# Altium schematic symbol library jlcpcb_2025_04_capacitors_extended_0603.schlib: 3668 symbols (part 14 of 20) (continued)
## FN18N4R7B500PSG
designator C?  Capacitance: 4.7pF  (hidden comment: *)
Capacitor, Ceramic (MLCC), 4.7pF, 50V, NP0, SMD 0603; Manufacturer: PSA(Prosperity Dielectrics); Manufacturer Part Number: FN18N4R7B500PSG; Package Size: 0603; JLCPCB Basic Part: No; JLCPCB Part Number: C565615; Supplier 1: LCSC; Category: Capacitors - MLCC; Supplier Part Number 1: C565615; Voltage Rating: 50V; Temperature Coefficient: NP0; RoHS: Yes; ComponentLink1Description: Datasheet; ComponentLink1URL: https://wmsc.lcsc.com/wmsc/upload/file/pdf/v2/lcsc/2304140030_PSA-Prosperity-Dielectrics-FN18N4R7B500PSG_C565615.pdf; ComponentLink2Description: JLCPCB Part URL; ComponentLink2URL: https://jlcpcb.com/partdetail/C565615; ComponentLink3Description: LCSC Part URL; ComponentLink3URL: https://lcsc.com/product-detail/Multilayer-Ceramic-Capacitors-MLCC---SMD-SMT_PSAProsperity-Dielectrics-PSAProsperity-Dielectrics-FN18N4R7B500PSG_C565615.html
footprint CAP-0603 (0603 (1608M) Capacitor)
pins: 1, 2

## FN18N4R7C500PSG
designator C?  Capacitance: 4.7pF  (hidden comment: *)
Capacitor, Ceramic (MLCC), 4.7pF, 50V, C0G, SMD 0603; Manufacturer: PSA(Prosperity Dielectrics); Manufacturer Part Number: FN18N4R7C500PSG; Package Size: 0603; JLCPCB Basic Part: No; JLCPCB Part Number: C525255; Supplier 1: LCSC; Category: Capacitors - MLCC; Supplier Part Number 1: C525255; Voltage Rating: 50V; Temperature Coefficient: C0G; RoHS: Yes; ComponentLink1Description: Datasheet; ComponentLink1URL: https://wmsc.lcsc.com/wmsc/upload/file/pdf/v2/lcsc/2304140030_PSA-Prosperity-Dielectrics-FN18N4R7C500PSG_C525255.pdf; ComponentLink2Description: JLCPCB Part URL; ComponentLink2URL: https://jlcpcb.com/partdetail/C525255; ComponentLink3Description: LCSC Part URL; ComponentLink3URL: https://lcsc.com/product-detail/Multilayer-Ceramic-Capacitors-MLCC---SMD-SMT_PSAProsperity-Dielectrics-PSAProsperity-Dielectrics-FN18N4R7C500PSG_C525255.html
footprint CAP-0603 (0603 (1608M) Capacitor)
pins: 1, 2

## FN18N5R0C500PSG
designator C?  Capacitance: 5pF  (hidden comment: *)
Capacitor, Ceramic (MLCC), 5pF, 50V, C0G, SMD 0603; Manufacturer: PSA(Prosperity Dielectrics); Manufacturer Part Number: FN18N5R0C500PSG; Package Size: 0603; JLCPCB Basic Part: No; JLCPCB Part Number: C2847431; Supplier 1: LCSC; Category: Capacitors - MLCC; Supplier Part Number 1: C2847431; Voltage Rating: 50V; Temperature Coefficient: C0G; RoHS: Yes; ComponentLink1Description: Datasheet; ComponentLink1URL: https://wmsc.lcsc.com/wmsc/upload/file/pdf/v2/lcsc/2108142130_PSA-Prosperity-Dielectrics-FN18N5R0C500PSG_C2847431.pdf; ComponentLink2Description: JLCPCB Part URL; ComponentLink2URL: https://jlcpcb.com/partdetail/C2847431; ComponentLink3Description: LCSC Part URL; ComponentLink3URL: https://lcsc.com/product-detail/Multilayer-Ceramic-Capacitors-MLCC---SMD-SMT_PSAProsperity-Dielectrics-PSAProsperity-Dielectrics-FN18N5R0C500PSG_C2847431.html
footprint CAP-0603 (0603 (1608M) Capacitor)
pins: 1, 2

## FN18N5R6C500PSG
designator C?  Capacitance: 5.6pF  (hidden comment: *)
Capacitor, Ceramic (MLCC), 5.6pF, 50V, C0G, SMD 0603; Manufacturer: PSA(Prosperity Dielectrics); Manufacturer Part Number: FN18N5R6C500PSG; Package Size: 0603; JLCPCB Basic Part: No; JLCPCB Part Number: C565616; Supplier 1: LCSC; Category: Capacitors - MLCC; Supplier Part Number 1: C565616; Voltage Rating: 50V; Temperature Coefficient: C0G; RoHS: Yes; ComponentLink1Description: Datasheet; ComponentLink1URL: https://wmsc.lcsc.com/wmsc/upload/file/pdf/v2/lcsc/2304140030_PSA-Prosperity-Dielectrics-FN18N5R6C500PSG_C565616.pdf; ComponentLink2Description: JLCPCB Part URL; ComponentLink2URL: https://jlcpcb.com/partdetail/C565616; ComponentLink3Description: LCSC Part URL; ComponentLink3URL: https://lcsc.com/product-detail/Multilayer-Ceramic-Capacitors-MLCC---SMD-SMT_PSAProsperity-Dielectrics-PSAProsperity-Dielectrics-FN18N5R6C500PSG_C565616.html
footprint CAP-0603 (0603 (1608M) Capacitor)
pins: 1, 2

## FN18N5R6D500PSG
designator C?  Capacitance: 5.6pF  (hidden comment: *)
Capacitor, Ceramic (MLCC), 5.6pF, 50V, C0G, SMD 0603; Manufacturer: PSA(Prosperity Dielectrics); Manufacturer Part Number: FN18N5R6D500PSG; Package Size: 0603; JLCPCB Basic Part: No; JLCPCB Part Number: C565567; Supplier 1: LCSC; Category: Capacitors - MLCC; Supplier Part Number 1: C565567; Voltage Rating: 50V; Temperature Coefficient: C0G; RoHS: Yes; ComponentLink1Description: Datasheet; ComponentLink1URL: https://wmsc.lcsc.com/wmsc/upload/file/pdf/v2/lcsc/2304140030_PSA-Prosperity-Dielectrics-FN18N5R6D500PSG_C565567.pdf; ComponentLink2Description: JLCPCB Part URL; ComponentLink2URL: https://jlcpcb.com/partdetail/C565567; ComponentLink3Description: LCSC Part URL; ComponentLink3URL: https://lcsc.com/product-detail/Multilayer-Ceramic-Capacitors-MLCC---SMD-SMT_PSAProsperity-Dielectrics-PSAProsperity-Dielectrics-FN18N5R6D500PSG_C565567.html
footprint CAP-0603 (0603 (1608M) Capacitor)
pins: 1, 2

## FN18N6R8C500PSG
designator C?  Capacitance: 6.8pF  (hidden comment: *)
Capacitor, Ceramic (MLCC), 6.8pF, 50V, NP0, SMD 0603; Manufacturer: PSA(Prosperity Dielectrics); Manufacturer Part Number: FN18N6R8C500PSG; Package Size: 0603; JLCPCB Basic Part: No; JLCPCB Part Number: C565617; Supplier 1: LCSC; Category: Capacitors - MLCC; Supplier Part Number 1: C565617; Voltage Rating: 50V; Temperature Coefficient: NP0; RoHS: Yes; ComponentLink1Description: Datasheet; ComponentLink1URL: https://wmsc.lcsc.com/wmsc/upload/file/pdf/v2/lcsc/2304140030_PSA-Prosperity-Dielectrics-FN18N6R8C500PSG_C565617.pdf; ComponentLink2Description: JLCPCB Part URL; ComponentLink2URL: https://jlcpcb.com/partdetail/C565617; ComponentLink3Description: LCSC Part URL; ComponentLink3URL: https://lcsc.com/product-detail/Multilayer-Ceramic-Capacitors-MLCC---SMD-SMT_PSAProsperity-Dielectrics-PSAProsperity-Dielectrics-FN18N6R8C500PSG_C565617.html
footprint CAP-0603 (0603 (1608M) Capacitor)
pins: 1, 2

## FN18N6R8D500PSG
designator C?  Capacitance: 6.8pF  (hidden comment: *)
Capacitor, Ceramic (MLCC), 6.8pF, 50V, C0G, SMD 0603; Manufacturer: PSA(Prosperity Dielectrics); Manufacturer Part Number: FN18N6R8D500PSG; Package Size: 0603; JLCPCB Basic Part: No; JLCPCB Part Number: C525260; Supplier 1: LCSC; Category: Capacitors - MLCC; Supplier Part Number 1: C525260; Voltage Rating: 50V; Temperature Coefficient: C0G; RoHS: Yes; ComponentLink1Description: Datasheet; ComponentLink1URL: https://wmsc.lcsc.com/wmsc/upload/file/pdf/v2/lcsc/2304140030_PSA-Prosperity-Dielectrics-FN18N6R8D500PSG_C525260.pdf; ComponentLink2Description: JLCPCB Part URL; ComponentLink2URL: https://jlcpcb.com/partdetail/C525260; ComponentLink3Description: LCSC Part URL; ComponentLink3URL: https://lcsc.com/product-detail/Multilayer-Ceramic-Capacitors-MLCC---SMD-SMT_PSAProsperity-Dielectrics-PSAProsperity-Dielectrics-FN18N6R8D500PSG_C525260.html
footprint CAP-0603 (0603 (1608M) Capacitor)
pins: 1, 2

## FN18N8R2C500PSG
designator C?  Capacitance: 8.2pF  (hidden comment: *)
Capacitor, Ceramic (MLCC), 8.2pF, 50V, C0G, SMD 0603; Manufacturer: PSA(Prosperity Dielectrics); Manufacturer Part Number: FN18N8R2C500PSG; Package Size: 0603; JLCPCB Basic Part: No; JLCPCB Part Number: C565618; Supplier 1: LCSC; Category: Capacitors - MLCC; Supplier Part Number 1: C565618; Voltage Rating: 50V; Temperature Coefficient: C0G; RoHS: Yes; ComponentLink1Description: Datasheet; ComponentLink1URL: https://wmsc.lcsc.com/wmsc/upload/file/pdf/v2/lcsc/2304140030_PSA-Prosperity-Dielectrics-FN18N8R2C500PSG_C565618.pdf; ComponentLink2Description: JLCPCB Part URL; ComponentLink2URL: https://jlcpcb.com/partdetail/C565618; ComponentLink3Description: LCSC Part URL; ComponentLink3URL: https://lcsc.com/product-detail/Multilayer-Ceramic-Capacitors-MLCC---SMD-SMT_PSAProsperity-Dielectrics-PSAProsperity-Dielectrics-FN18N8R2C500PSG_C565618.html
footprint CAP-0603 (0603 (1608M) Capacitor)
pins: 1, 2

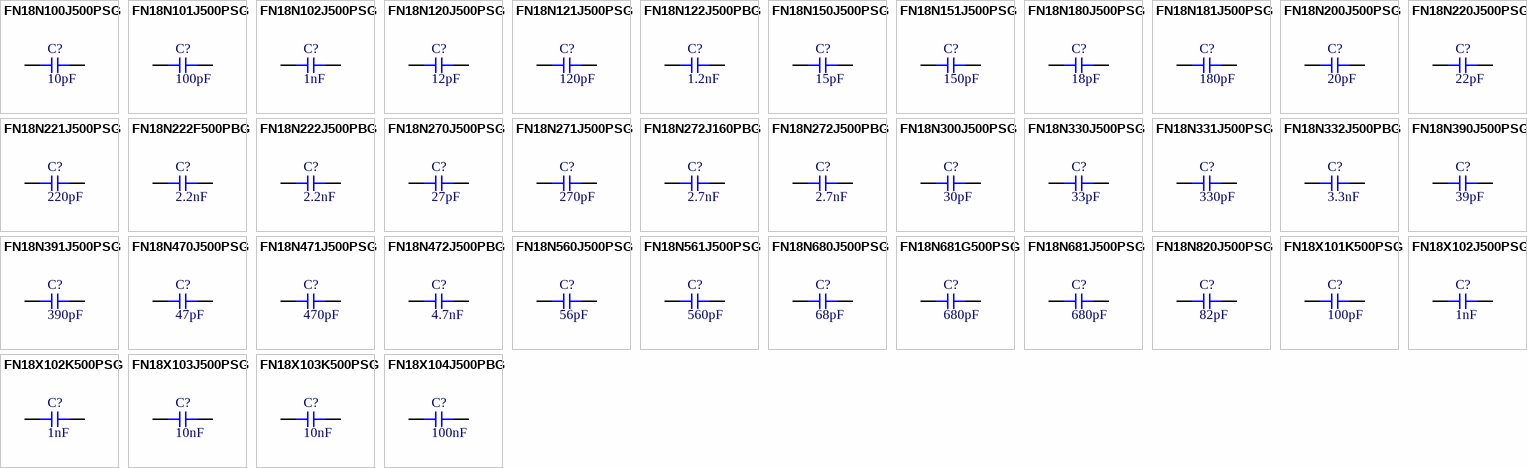
[diagram p64: symbols FN18N100J500PSG to FN18X104J500PBG]

## FN18N100J500PSG
designator C?  Capacitance: 10pF  (hidden comment: *)
Capacitor, Ceramic (MLCC), 10pF, ±5%, 50V, NP0, ±5%, SMD 0603; Manufacturer: PSA(Prosperity Dielectrics); Manufacturer Part Number: FN18N100J500PSG; Package Size: 0603; JLCPCB Basic Part: No; JLCPCB Part Number: C525235; Supplier 1: LCSC; Category: Capacitors - MLCC; Supplier Part Number 1: C525235; Tolerance: ±5%; Voltage Rating: 50V; Temperature Coefficient: NP0; RoHS: Yes; ComponentLink1Description: Datasheet; ComponentLink1URL: https://wmsc.lcsc.com/wmsc/upload/file/pdf/v2/lcsc/2304140030_PSA-Prosperity-Dielectrics-FN18N100J500PSG_C525235.pdf; ComponentLink2Description: JLCPCB Part URL; ComponentLink2URL: https://jlcpcb.com/partdetail/C525235; ComponentLink3Description: LCSC Part URL; ComponentLink3URL: https://lcsc.com/product-detail/Multilayer-Ceramic-Capacitors-MLCC---SMD-SMT_PSAProsperity-Dielectrics-PSAProsperity-Dielectrics-FN18N100J500PSG_C525235.html
footprint CAP-0603 (0603 (1608M) Capacitor)
pins: 1, 2

## FN18N101J500PSG
designator C?  Capacitance: 100pF  (hidden comment: *)
Capacitor, Ceramic (MLCC), 100pF, ±5%, 50V, NP0, ±5%, SMD 0603; Manufacturer: PSA(Prosperity Dielectrics); Manufacturer Part Number: FN18N101J500PSG; Package Size: 0603; JLCPCB Basic Part: No; JLCPCB Part Number: C525236; Supplier 1: LCSC; Category: Capacitors - MLCC; Supplier Part Number 1: C525236; Tolerance: ±5%; Voltage Rating: 50V; Temperature Coefficient: NP0; RoHS: Yes; ComponentLink1Description: Datasheet; ComponentLink1URL: https://wmsc.lcsc.com/wmsc/upload/file/pdf/v2/lcsc/2304140030_PSA-Prosperity-Dielectrics-FN18N101J500PSG_C525236.pdf; ComponentLink2Description: JLCPCB Part URL; ComponentLink2URL: https://jlcpcb.com/partdetail/C525236; ComponentLink3Description: LCSC Part URL; ComponentLink3URL: https://lcsc.com/product-detail/Multilayer-Ceramic-Capacitors-MLCC---SMD-SMT_PSAProsperity-Dielectrics-PSAProsperity-Dielectrics-FN18N101J500PSG_C525236.html
footprint CAP-0603 (0603 (1608M) Capacitor)
pins: 1, 2

## FN18N102J500PSG
designator C?  Capacitance: 1nF  (hidden comment: *)
Capacitor, Ceramic (MLCC), 1nF, ±5%, 50V, NP0, ±5%, SMD 0603; Manufacturer: PSA(Prosperity Dielectrics); Manufacturer Part Number: FN18N102J500PSG; Package Size: 0603; JLCPCB Basic Part: No; JLCPCB Part Number: C525237; Supplier 1: LCSC; Category: Capacitors - MLCC; Supplier Part Number 1: C525237; Tolerance: ±5%; Voltage Rating: 50V; Temperature Coefficient: NP0; RoHS: Yes; ComponentLink1Description: Datasheet; ComponentLink1URL: https://wmsc.lcsc.com/wmsc/upload/file/pdf/v2/lcsc/2304140030_PSA-Prosperity-Dielectrics-FN18N102J500PSG_C525237.pdf; ComponentLink2Description: JLCPCB Part URL; ComponentLink2URL: https://jlcpcb.com/partdetail/C525237; ComponentLink3Description: LCSC Part URL; ComponentLink3URL: https://lcsc.com/product-detail/Multilayer-Ceramic-Capacitors-MLCC---SMD-SMT_PSAProsperity-Dielectrics-PSAProsperity-Dielectrics-FN18N102J500PSG_C525237.html
footprint CAP-0603 (0603 (1608M) Capacitor)
pins: 1, 2

## FN18N120J500PSG
designator C?  Capacitance: 12pF  (hidden comment: *)
Capacitor, Ceramic (MLCC), 12pF, ±5%, 50V, C0G, ±5%, SMD 0603; Manufacturer: PSA(Prosperity Dielectrics); Manufacturer Part Number: FN18N120J500PSG; Package Size: 0603; JLCPCB Basic Part: No; JLCPCB Part Number: C363546; Supplier 1: LCSC; Category: Capacitors - MLCC; Supplier Part Number 1: C363546; Tolerance: ±5%; Voltage Rating: 50V; Temperature Coefficient: C0G; RoHS: Yes; ComponentLink1Description: Datasheet; ComponentLink1URL: https://wmsc.lcsc.com/wmsc/upload/file/pdf/v2/lcsc/2304140030_PSA-Prosperity-Dielectrics-FN18N120J500PSG_C363546.pdf; ComponentLink2Description: JLCPCB Part URL; ComponentLink2URL: https://jlcpcb.com/partdetail/C363546; ComponentLink3Description: LCSC Part URL; ComponentLink3URL: https://lcsc.com/product-detail/Multilayer-Ceramic-Capacitors-MLCC---SMD-SMT_PSAProsperity-Dielectrics-PSAProsperity-Dielectrics-FN18N120J500PSG_C363546.html
footprint CAP-0603 (0603 (1608M) Capacitor)
pins: 1, 2

## FN18N121J500PSG
designator C?  Capacitance: 120pF  (hidden comment: *)
Capacitor, Ceramic (MLCC), 120pF, ±5%, 50V, C0G, ±5%, SMD 0603; Manufacturer: PSA(Prosperity Dielectrics); Manufacturer Part Number: FN18N121J500PSG; Package Size: 0603; JLCPCB Basic Part: No; JLCPCB Part Number: C565571; Supplier 1: LCSC; Category: Capacitors - MLCC; Supplier Part Number 1: C565571; Tolerance: ±5%; Voltage Rating: 50V; Temperature Coefficient: C0G; RoHS: Yes; ComponentLink1Description: Datasheet; ComponentLink1URL: https://wmsc.lcsc.com/wmsc/upload/file/pdf/v2/lcsc/2304140030_PSA-Prosperity-Dielectrics-FN18N121J500PSG_C565571.pdf; ComponentLink2Description: JLCPCB Part URL; ComponentLink2URL: https://jlcpcb.com/partdetail/C565571; ComponentLink3Description: LCSC Part URL; ComponentLink3URL: https://lcsc.com/product-detail/Multilayer-Ceramic-Capacitors-MLCC---SMD-SMT_PSAProsperity-Dielectrics-PSAProsperity-Dielectrics-FN18N121J500PSG_C565571.html
footprint CAP-0603 (0603 (1608M) Capacitor)
pins: 1, 2

## FN18N122J500PBG
designator C?  Capacitance: 1.2nF  (hidden comment: *)
Capacitor, Ceramic (MLCC), 1.2nF, 50V, C0G, SMD 0603; Manufacturer: PSA(Prosperity Dielectrics); Manufacturer Part Number: FN18N122J500PBG; Package Size: 0603; JLCPCB Basic Part: No; JLCPCB Part Number: C2929143; Supplier 1: LCSC; Category: Capacitors - MLCC; Supplier Part Number 1: C2929143; Voltage Rating: 50V; Temperature Coefficient: C0G; RoHS: Yes; ComponentLink1Description: Datasheet; ComponentLink1URL: https://wmsc.lcsc.com/wmsc/upload/file/pdf/v2/lcsc/2201121400_PSA-Prosperity-Dielectrics-FN18N122J500PBG_C2929143.pdf; ComponentLink2Description: JLCPCB Part URL; ComponentLink2URL: https://jlcpcb.com/partdetail/C2929143; ComponentLink3Description: LCSC Part URL; ComponentLink3URL: https://lcsc.com/product-detail/Multilayer-Ceramic-Capacitors-MLCC---SMD-SMT_PSAProsperity-Dielectrics-PSAProsperity-Dielectrics-FN18N122J500PBG_C2929143.html
footprint CAP-0603 (0603 (1608M) Capacitor)
pins: 1, 2

## FN18N150J500PSG
designator C?  Capacitance: 15pF  (hidden comment: *)
Capacitor, Ceramic (MLCC), 15pF, ±5%, 50V, C0G, ±5%, SMD 0603; Manufacturer: PSA(Prosperity Dielectrics); Manufacturer Part Number: FN18N150J500PSG; Package Size: 0603; JLCPCB Basic Part: No; JLCPCB Part Number: C525238; Supplier 1: LCSC; Category: Capacitors - MLCC; Supplier Part Number 1: C525238; Tolerance: ±5%; Voltage Rating: 50V; Temperature Coefficient: C0G; RoHS: Yes; ComponentLink1Description: Datasheet; ComponentLink1URL: https://wmsc.lcsc.com/wmsc/upload/file/pdf/v2/lcsc/2304140030_PSA-Prosperity-Dielectrics-FN18N150J500PSG_C525238.pdf; ComponentLink2Description: JLCPCB Part URL; ComponentLink2URL: https://jlcpcb.com/partdetail/C525238; ComponentLink3Description: LCSC Part URL; ComponentLink3URL: https://lcsc.com/product-detail/Multilayer-Ceramic-Capacitors-MLCC---SMD-SMT_PSAProsperity-Dielectrics-PSAProsperity-Dielectrics-FN18N150J500PSG_C525238.html
footprint CAP-0603 (0603 (1608M) Capacitor)
pins: 1, 2

## FN18N151J500PSG
designator C?  Capacitance: 150pF  (hidden comment: *)
Capacitor, Ceramic (MLCC), 150pF, ±5%, 50V, NP0, ±5%, SMD 0603; Manufacturer: PSA(Prosperity Dielectrics); Manufacturer Part Number: FN18N151J500PSG; Package Size: 0603; JLCPCB Basic Part: No; JLCPCB Part Number: C565572; Supplier 1: LCSC; Category: Capacitors - MLCC; Supplier Part Number 1: C565572; Tolerance: ±5%; Voltage Rating: 50V; Temperature Coefficient: NP0; RoHS: Yes; ComponentLink1Description: Datasheet; ComponentLink1URL: https://wmsc.lcsc.com/wmsc/upload/file/pdf/v2/lcsc/2304140030_PSA-Prosperity-Dielectrics-FN18N151J500PSG_C565572.pdf; ComponentLink2Description: JLCPCB Part URL; ComponentLink2URL: https://jlcpcb.com/partdetail/C565572; ComponentLink3Description: LCSC Part URL; ComponentLink3URL: https://lcsc.com/product-detail/Multilayer-Ceramic-Capacitors-MLCC---SMD-SMT_PSAProsperity-Dielectrics-PSAProsperity-Dielectrics-FN18N151J500PSG_C565572.html
footprint CAP-0603 (0603 (1608M) Capacitor)
pins: 1, 2

## FN18N180J500PSG
designator C?  Capacitance: 18pF  (hidden comment: *)
Capacitor, Ceramic (MLCC), 18pF, ±5%, 50V, C0G, ±5%, SMD 0603; Manufacturer: PSA(Prosperity Dielectrics); Manufacturer Part Number: FN18N180J500PSG; Package Size: 0603; JLCPCB Basic Part: No; JLCPCB Part Number: C363547; Supplier 1: LCSC; Category: Capacitors - MLCC; Supplier Part Number 1: C363547; Tolerance: ±5%; Voltage Rating: 50V; Temperature Coefficient: C0G; RoHS: Yes; ComponentLink1Description: Datasheet; ComponentLink1URL: https://wmsc.lcsc.com/wmsc/upload/file/pdf/v2/lcsc/2304140030_PSA-Prosperity-Dielectrics-FN18N180J500PSG_C363547.pdf; ComponentLink2Description: JLCPCB Part URL; ComponentLink2URL: https://jlcpcb.com/partdetail/C363547; ComponentLink3Description: LCSC Part URL; ComponentLink3URL: https://lcsc.com/product-detail/Multilayer-Ceramic-Capacitors-MLCC---SMD-SMT_PSAProsperity-Dielectrics-PSAProsperity-Dielectrics-FN18N180J500PSG_C363547.html
footprint CAP-0603 (0603 (1608M) Capacitor)
pins: 1, 2

## FN18N181J500PSG
designator C?  Capacitance: 180pF  (hidden comment: *)
Capacitor, Ceramic (MLCC), 180pF, ±5%, 50V, C0G, ±5%, SMD 0603; Manufacturer: PSA(Prosperity Dielectrics); Manufacturer Part Number: FN18N181J500PSG; Package Size: 0603; JLCPCB Basic Part: No; JLCPCB Part Number: C525239; Supplier 1: LCSC; Category: Capacitors - MLCC; Supplier Part Number 1: C525239; Tolerance: ±5%; Voltage Rating: 50V; Temperature Coefficient: C0G; RoHS: Yes; ComponentLink1Description: Datasheet; ComponentLink1URL: https://wmsc.lcsc.com/wmsc/upload/file/pdf/v2/lcsc/2304140030_PSA-Prosperity-Dielectrics-FN18N181J500PSG_C525239.pdf; ComponentLink2Description: JLCPCB Part URL; ComponentLink2URL: https://jlcpcb.com/partdetail/C525239; ComponentLink3Description: LCSC Part URL; ComponentLink3URL: https://lcsc.com/product-detail/Multilayer-Ceramic-Capacitors-MLCC---SMD-SMT_PSAProsperity-Dielectrics-PSAProsperity-Dielectrics-FN18N181J500PSG_C525239.html
footprint CAP-0603 (0603 (1608M) Capacitor)
pins: 1, 2

## FN18N200J500PSG
designator C?  Capacitance: 20pF  (hidden comment: *)
Capacitor, Ceramic (MLCC), 20pF, ±5%, 50V, C0G, ±5%, SMD 0603; Manufacturer: PSA(Prosperity Dielectrics); Manufacturer Part Number: FN18N200J500PSG; Package Size: 0603; JLCPCB Basic Part: No; JLCPCB Part Number: C525243; Supplier 1: LCSC; Category: Capacitors - MLCC; Supplier Part Number 1: C525243; Tolerance: ±5%; Voltage Rating: 50V; Temperature Coefficient: C0G; RoHS: Yes; ComponentLink1Description: Datasheet; ComponentLink1URL: https://wmsc.lcsc.com/wmsc/upload/file/pdf/v2/lcsc/2304140030_PSA-Prosperity-Dielectrics-FN18N200J500PSG_C525243.pdf; ComponentLink2Description: JLCPCB Part URL; ComponentLink2URL: https://jlcpcb.com/partdetail/C525243; ComponentLink3Description: LCSC Part URL; ComponentLink3URL: https://lcsc.com/product-detail/Multilayer-Ceramic-Capacitors-MLCC---SMD-SMT_PSAProsperity-Dielectrics-PSAProsperity-Dielectrics-FN18N200J500PSG_C525243.html
footprint CAP-0603 (0603 (1608M) Capacitor)
pins: 1, 2

## FN18N220J500PSG
designator C?  Capacitance: 22pF  (hidden comment: *)
Capacitor, Ceramic (MLCC), 22pF, ±5%, 50V, C0G, ±5%, SMD 0603; Manufacturer: PSA(Prosperity Dielectrics); Manufacturer Part Number: FN18N220J500PSG; Package Size: 0603; JLCPCB Basic Part: No; JLCPCB Part Number: C525244; Supplier 1: LCSC; Category: Capacitors - MLCC; Supplier Part Number 1: C525244; Tolerance: ±5%; Voltage Rating: 50V; Temperature Coefficient: C0G; RoHS: Yes; ComponentLink1Description: Datasheet; ComponentLink1URL: https://wmsc.lcsc.com/wmsc/upload/file/pdf/v2/lcsc/2304140030_PSA-Prosperity-Dielectrics-FN18N220J500PSG_C525244.pdf; ComponentLink2Description: JLCPCB Part URL; ComponentLink2URL: https://jlcpcb.com/partdetail/C525244; ComponentLink3Description: LCSC Part URL; ComponentLink3URL: https://lcsc.com/product-detail/Multilayer-Ceramic-Capacitors-MLCC---SMD-SMT_PSAProsperity-Dielectrics-PSAProsperity-Dielectrics-FN18N220J500PSG_C525244.html
footprint CAP-0603 (0603 (1608M) Capacitor)
pins: 1, 2

## FN18N221J500PSG
designator C?  Capacitance: 220pF  (hidden comment: *)
Capacitor, Ceramic (MLCC), 220pF, ±5%, 50V, C0G, ±5%, SMD 0603; Manufacturer: PSA(Prosperity Dielectrics); Manufacturer Part Number: FN18N221J500PSG; Package Size: 0603; JLCPCB Basic Part: No; JLCPCB Part Number: C525245; Supplier 1: LCSC; Category: Capacitors - MLCC; Supplier Part Number 1: C525245; Tolerance: ±5%; Voltage Rating: 50V; Temperature Coefficient: C0G; RoHS: Yes; ComponentLink1Description: Datasheet; ComponentLink1URL: https://wmsc.lcsc.com/wmsc/upload/file/pdf/v2/lcsc/2304140030_PSA-Prosperity-Dielectrics-FN18N221J500PSG_C525245.pdf; ComponentLink2Description: JLCPCB Part URL; ComponentLink2URL: https://jlcpcb.com/partdetail/C525245; ComponentLink3Description: LCSC Part URL; ComponentLink3URL: https://lcsc.com/product-detail/Multilayer-Ceramic-Capacitors-MLCC---SMD-SMT_PSAProsperity-Dielectrics-PSAProsperity-Dielectrics-FN18N221J500PSG_C525245.html
footprint CAP-0603 (0603 (1608M) Capacitor)
pins: 1, 2

## FN18N222F500PBG
designator C?  Capacitance: 2.2nF  (hidden comment: *)
Capacitor, Ceramic (MLCC), 2.2nF, ±1%, 50V, C0G, ±1%, SMD 0603; Manufacturer: PSA(Prosperity Dielectrics); Manufacturer Part Number: FN18N222F500PBG; Package Size: 0603; JLCPCB Basic Part: No; JLCPCB Part Number: C2929149; Supplier 1: LCSC; Category: Capacitors - MLCC; Supplier Part Number 1: C2929149; Tolerance: ±1%; Voltage Rating: 50V; Temperature Coefficient: C0G; RoHS: Yes; ComponentLink1Description: Datasheet; ComponentLink1URL: https://wmsc.lcsc.com/wmsc/upload/file/pdf/v2/lcsc/2201121400_PSA-Prosperity-Dielectrics-FN18N222F500PBG_C2929149.pdf; ComponentLink2Description: JLCPCB Part URL; ComponentLink2URL: https://jlcpcb.com/partdetail/C2929149; ComponentLink3Description: LCSC Part URL; ComponentLink3URL: https://lcsc.com/product-detail/Multilayer-Ceramic-Capacitors-MLCC---SMD-SMT_PSAProsperity-Dielectrics-PSAProsperity-Dielectrics-FN18N222F500PBG_C2929149.html
footprint CAP-0603 (0603 (1608M) Capacitor)
pins: 1, 2

## FN18N222J500PBG
designator C?  Capacitance: 2.2nF  (hidden comment: *)
Capacitor, Ceramic (MLCC), 2.2nF, ±5%, 50V, C0G, ±5%, SMD 0603; Manufacturer: PSA(Prosperity Dielectrics); Manufacturer Part Number: FN18N222J500PBG; Package Size: 0603; JLCPCB Basic Part: No; JLCPCB Part Number: C2847442; Supplier 1: LCSC; Category: Capacitors - MLCC; Supplier Part Number 1: C2847442; Tolerance: ±5%; Voltage Rating: 50V; Temperature Coefficient: C0G; RoHS: Yes; ComponentLink1Description: Datasheet; ComponentLink1URL: https://wmsc.lcsc.com/wmsc/upload/file/pdf/v2/lcsc/2108142230_PSA-Prosperity-Dielectrics-FN18N222J500PBG_C2847442.pdf; ComponentLink2Description: JLCPCB Part URL; ComponentLink2URL: https://jlcpcb.com/partdetail/C2847442; ComponentLink3Description: LCSC Part URL; ComponentLink3URL: https://lcsc.com/product-detail/Multilayer-Ceramic-Capacitors-MLCC---SMD-SMT_PSAProsperity-Dielectrics-PSAProsperity-Dielectrics-FN18N222J500PBG_C2847442.html
footprint CAP-0603 (0603 (1608M) Capacitor)
pins: 1, 2

## FN18N270J500PSG
designator C?  Capacitance: 27pF  (hidden comment: *)
Capacitor, Ceramic (MLCC), 27pF, ±5%, 50V, C0G, ±5%, SMD 0603; Manufacturer: PSA(Prosperity Dielectrics); Manufacturer Part Number: FN18N270J500PSG; Package Size: 0603; JLCPCB Basic Part: No; JLCPCB Part Number: C525246; Supplier 1: LCSC; Category: Capacitors - MLCC; Supplier Part Number 1: C525246; Tolerance: ±5%; Voltage Rating: 50V; Temperature Coefficient: C0G; RoHS: Yes; ComponentLink1Description: Datasheet; ComponentLink1URL: https://wmsc.lcsc.com/wmsc/upload/file/pdf/v2/lcsc/2304140030_PSA-Prosperity-Dielectrics-FN18N270J500PSG_C525246.pdf; ComponentLink2Description: JLCPCB Part URL; ComponentLink2URL: https://jlcpcb.com/partdetail/C525246; ComponentLink3Description: LCSC Part URL; ComponentLink3URL: https://lcsc.com/product-detail/Multilayer-Ceramic-Capacitors-MLCC---SMD-SMT_PSAProsperity-Dielectrics-PSAProsperity-Dielectrics-FN18N270J500PSG_C525246.html
footprint CAP-0603 (0603 (1608M) Capacitor)
pins: 1, 2

## FN18N271J500PSG
designator C?  Capacitance: 270pF  (hidden comment: *)
Capacitor, Ceramic (MLCC), 270pF, ±5%, 50V, NP0, ±5%, SMD 0603; Manufacturer: PSA(Prosperity Dielectrics); Manufacturer Part Number: FN18N271J500PSG; Package Size: 0603; JLCPCB Basic Part: No; JLCPCB Part Number: C565573; Supplier 1: LCSC; Category: Capacitors - MLCC; Supplier Part Number 1: C565573; Tolerance: ±5%; Voltage Rating: 50V; Temperature Coefficient: NP0; RoHS: Yes; ComponentLink1Description: Datasheet; ComponentLink1URL: https://wmsc.lcsc.com/wmsc/upload/file/pdf/v2/lcsc/2304140030_PSA-Prosperity-Dielectrics-FN18N271J500PSG_C565573.pdf; ComponentLink2Description: JLCPCB Part URL; ComponentLink2URL: https://jlcpcb.com/partdetail/C565573; ComponentLink3Description: LCSC Part URL; ComponentLink3URL: https://lcsc.com/product-detail/Multilayer-Ceramic-Capacitors-MLCC---SMD-SMT_PSAProsperity-Dielectrics-PSAProsperity-Dielectrics-FN18N271J500PSG_C565573.html
footprint CAP-0603 (0603 (1608M) Capacitor)
pins: 1, 2

## FN18N272J160PBG
designator C?  Capacitance: 2.7nF  (hidden comment: *)
Capacitor, Ceramic (MLCC), 2.7nF, ±5%, 16V, C0G, ±5%, SMD 0603; Manufacturer: PSA(Prosperity Dielectrics); Manufacturer Part Number: FN18N272J160PBG; Package Size: 0603; JLCPCB Basic Part: No; JLCPCB Part Number: C525247; Supplier 1: LCSC; Category: Capacitors - MLCC; Supplier Part Number 1: C525247; Tolerance: ±5%; Voltage Rating: 16V; Temperature Coefficient: C0G; RoHS: Yes; ComponentLink1Description: Datasheet; ComponentLink1URL: https://wmsc.lcsc.com/wmsc/upload/file/pdf/v2/lcsc/2304140030_PSA-Prosperity-Dielectrics-FN18N272J160PBG_C525247.pdf; ComponentLink2Description: JLCPCB Part URL; ComponentLink2URL: https://jlcpcb.com/partdetail/C525247; ComponentLink3Description: LCSC Part URL; ComponentLink3URL: https://lcsc.com/product-detail/Multilayer-Ceramic-Capacitors-MLCC---SMD-SMT_PSAProsperity-Dielectrics-PSAProsperity-Dielectrics-FN18N272J160PBG_C525247.html
footprint CAP-0603 (0603 (1608M) Capacitor)
pins: 1, 2

## FN18N272J500PBG
designator C?  Capacitance: 2.7nF  (hidden comment: *)
Capacitor, Ceramic (MLCC), 2.7nF, 50V, C0G, SMD 0603; Manufacturer: PSA(Prosperity Dielectrics); Manufacturer Part Number: FN18N272J500PBG; Package Size: 0603; JLCPCB Basic Part: No; JLCPCB Part Number: C2929151; Supplier 1: LCSC; Category: Capacitors - MLCC; Supplier Part Number 1: C2929151; Voltage Rating: 50V; Temperature Coefficient: C0G; RoHS: Yes; ComponentLink1Description: Datasheet; ComponentLink1URL: https://wmsc.lcsc.com/wmsc/upload/file/pdf/v2/lcsc/2201121400_PSA-Prosperity-Dielectrics-FN18N272J500PBG_C2929151.pdf; ComponentLink2Description: JLCPCB Part URL; ComponentLink2URL: https://jlcpcb.com/partdetail/C2929151; ComponentLink3Description: LCSC Part URL; ComponentLink3URL: https://lcsc.com/product-detail/Multilayer-Ceramic-Capacitors-MLCC---SMD-SMT_PSAProsperity-Dielectrics-PSAProsperity-Dielectrics-FN18N272J500PBG_C2929151.html
footprint CAP-0603 (0603 (1608M) Capacitor)
pins: 1, 2

## FN18N300J500PSG
designator C?  Capacitance: 30pF  (hidden comment: *)
Capacitor, Ceramic (MLCC), 30pF, ±5%, 50V, C0G, ±5%, SMD 0603; Manufacturer: PSA(Prosperity Dielectrics); Manufacturer Part Number: FN18N300J500PSG; Package Size: 0603; JLCPCB Basic Part: No; JLCPCB Part Number: C363550; Supplier 1: LCSC; Category: Capacitors - MLCC; Supplier Part Number 1: C363550; Tolerance: ±5%; Voltage Rating: 50V; Temperature Coefficient: C0G; RoHS: Yes; ComponentLink1Description: Datasheet; ComponentLink1URL: https://wmsc.lcsc.com/wmsc/upload/file/pdf/v2/lcsc/2304140030_PSA-Prosperity-Dielectrics-FN18N300J500PSG_C363550.pdf; ComponentLink2Description: JLCPCB Part URL; ComponentLink2URL: https://jlcpcb.com/partdetail/C363550; ComponentLink3Description: LCSC Part URL; ComponentLink3URL: https://lcsc.com/product-detail/Multilayer-Ceramic-Capacitors-MLCC---SMD-SMT_PSAProsperity-Dielectrics-PSAProsperity-Dielectrics-FN18N300J500PSG_C363550.html
footprint CAP-0603 (0603 (1608M) Capacitor)
pins: 1, 2

## FN18N330J500PSG
designator C?  Capacitance: 33pF  (hidden comment: *)
Capacitor, Ceramic (MLCC), 33pF, ±5%, 50V, C0G, ±5%, SMD 0603; Manufacturer: PSA(Prosperity Dielectrics); Manufacturer Part Number: FN18N330J500PSG; Package Size: 0603; JLCPCB Basic Part: No; JLCPCB Part Number: C363551; Supplier 1: LCSC; Category: Capacitors - MLCC; Supplier Part Number 1: C363551; Tolerance: ±5%; Voltage Rating: 50V; Temperature Coefficient: C0G; RoHS: Yes; ComponentLink1Description: Datasheet; ComponentLink1URL: https://wmsc.lcsc.com/wmsc/upload/file/pdf/v2/lcsc/2304140030_PSA-Prosperity-Dielectrics-FN18N330J500PSG_C363551.pdf; ComponentLink2Description: JLCPCB Part URL; ComponentLink2URL: https://jlcpcb.com/partdetail/C363551; ComponentLink3Description: LCSC Part URL; ComponentLink3URL: https://lcsc.com/product-detail/Multilayer-Ceramic-Capacitors-MLCC---SMD-SMT_PSAProsperity-Dielectrics-PSAProsperity-Dielectrics-FN18N330J500PSG_C363551.html
footprint CAP-0603 (0603 (1608M) Capacitor)
pins: 1, 2

## FN18N331J500PSG
designator C?  Capacitance: 330pF  (hidden comment: *)
Capacitor, Ceramic (MLCC), 330pF, ±5%, 50V, C0G, ±5%, SMD 0603; Manufacturer: PSA(Prosperity Dielectrics); Manufacturer Part Number: FN18N331J500PSG; Package Size: 0603; JLCPCB Basic Part: No; JLCPCB Part Number: C525250; Supplier 1: LCSC; Category: Capacitors - MLCC; Supplier Part Number 1: C525250; Tolerance: ±5%; Voltage Rating: 50V; Temperature Coefficient: C0G; RoHS: Yes; ComponentLink1Description: Datasheet; ComponentLink1URL: https://wmsc.lcsc.com/wmsc/upload/file/pdf/v2/lcsc/2304140030_PSA-Prosperity-Dielectrics-FN18N331J500PSG_C525250.pdf; ComponentLink2Description: JLCPCB Part URL; ComponentLink2URL: https://jlcpcb.com/partdetail/C525250; ComponentLink3Description: LCSC Part URL; ComponentLink3URL: https://lcsc.com/product-detail/Multilayer-Ceramic-Capacitors-MLCC---SMD-SMT_PSAProsperity-Dielectrics-PSAProsperity-Dielectrics-FN18N331J500PSG_C525250.html
footprint CAP-0603 (0603 (1608M) Capacitor)
pins: 1, 2

## FN18N332J500PBG
designator C?  Capacitance: 3.3nF  (hidden comment: *)
Capacitor, Ceramic (MLCC), 3.3nF, 50V, C0G, SMD 0603; Manufacturer: PSA(Prosperity Dielectrics); Manufacturer Part Number: FN18N332J500PBG; Package Size: 0603; JLCPCB Basic Part: No; JLCPCB Part Number: C2847441; Supplier 1: LCSC; Category: Capacitors - MLCC; Supplier Part Number 1: C2847441; Voltage Rating: 50V; Temperature Coefficient: C0G; RoHS: Yes; ComponentLink1Description: Datasheet; ComponentLink1URL: https://wmsc.lcsc.com/wmsc/upload/file/pdf/v2/lcsc/2108142230_PSA-Prosperity-Dielectrics-FN18N332J500PBG_C2847441.pdf; ComponentLink2Description: JLCPCB Part URL; ComponentLink2URL: https://jlcpcb.com/partdetail/C2847441; ComponentLink3Description: LCSC Part URL; ComponentLink3URL: https://lcsc.com/product-detail/Multilayer-Ceramic-Capacitors-MLCC---SMD-SMT_PSAProsperity-Dielectrics-PSAProsperity-Dielectrics-FN18N332J500PBG_C2847441.html
footprint CAP-0603 (0603 (1608M) Capacitor)
pins: 1, 2

## FN18N390J500PSG
designator C?  Capacitance: 39pF  (hidden comment: *)
Capacitor, Ceramic (MLCC), 39pF, ±5%, 50V, C0G, ±5%, SMD 0603; Manufacturer: PSA(Prosperity Dielectrics); Manufacturer Part Number: FN18N390J500PSG; Package Size: 0603; JLCPCB Basic Part: No; JLCPCB Part Number: C363552; Supplier 1: LCSC; Category: Capacitors - MLCC; Supplier Part Number 1: C363552; Tolerance: ±5%; Voltage Rating: 50V; Temperature Coefficient: C0G; RoHS: Yes; ComponentLink1Description: Datasheet; ComponentLink1URL: https://wmsc.lcsc.com/wmsc/upload/file/pdf/v2/lcsc/2304140030_PSA-Prosperity-Dielectrics-FN18N390J500PSG_C363552.pdf; ComponentLink2Description: JLCPCB Part URL; ComponentLink2URL: https://jlcpcb.com/partdetail/C363552; ComponentLink3Description: LCSC Part URL; ComponentLink3URL: https://lcsc.com/product-detail/Multilayer-Ceramic-Capacitors-MLCC---SMD-SMT_PSAProsperity-Dielectrics-PSAProsperity-Dielectrics-FN18N390J500PSG_C363552.html
footprint CAP-0603 (0603 (1608M) Capacitor)
pins: 1, 2

## FN18N391J500PSG
designator C?  Capacitance: 390pF  (hidden comment: *)
Capacitor, Ceramic (MLCC), 390pF, ±5%, 50V, C0G, ±5%, SMD 0603; Manufacturer: PSA(Prosperity Dielectrics); Manufacturer Part Number: FN18N391J500PSG; Package Size: 0603; JLCPCB Basic Part: No; JLCPCB Part Number: C565574; Supplier 1: LCSC; Category: Capacitors - MLCC; Supplier Part Number 1: C565574; Tolerance: ±5%; Voltage Rating: 50V; Temperature Coefficient: C0G; RoHS: Yes; ComponentLink1Description: Datasheet; ComponentLink1URL: https://wmsc.lcsc.com/wmsc/upload/file/pdf/v2/lcsc/2304140030_PSA-Prosperity-Dielectrics-FN18N391J500PSG_C565574.pdf; ComponentLink2Description: JLCPCB Part URL; ComponentLink2URL: https://jlcpcb.com/partdetail/C565574; ComponentLink3Description: LCSC Part URL; ComponentLink3URL: https://lcsc.com/product-detail/Multilayer-Ceramic-Capacitors-MLCC---SMD-SMT_PSAProsperity-Dielectrics-PSAProsperity-Dielectrics-FN18N391J500PSG_C565574.html
footprint CAP-0603 (0603 (1608M) Capacitor)
pins: 1, 2

## FN18N470J500PSG
designator C?  Capacitance: 47pF  (hidden comment: *)
Capacitor, Ceramic (MLCC), 47pF, ±5%, 50V, C0G, ±5%, SMD 0603; Manufacturer: PSA(Prosperity Dielectrics); Manufacturer Part Number: FN18N470J500PSG; Package Size: 0603; JLCPCB Basic Part: No; JLCPCB Part Number: C525253; Supplier 1: LCSC; Category: Capacitors - MLCC; Supplier Part Number 1: C525253; Tolerance: ±5%; Voltage Rating: 50V; Temperature Coefficient: C0G; RoHS: Yes; ComponentLink1Description: Datasheet; ComponentLink1URL: https://wmsc.lcsc.com/wmsc/upload/file/pdf/v2/lcsc/2304140030_PSA-Prosperity-Dielectrics-FN18N470J500PSG_C525253.pdf; ComponentLink2Description: JLCPCB Part URL; ComponentLink2URL: https://jlcpcb.com/partdetail/C525253; ComponentLink3Description: LCSC Part URL; ComponentLink3URL: https://lcsc.com/product-detail/Multilayer-Ceramic-Capacitors-MLCC---SMD-SMT_PSAProsperity-Dielectrics-PSAProsperity-Dielectrics-FN18N470J500PSG_C525253.html
footprint CAP-0603 (0603 (1608M) Capacitor)
pins: 1, 2

## FN18N471J500PSG
designator C?  Capacitance: 470pF  (hidden comment: *)
Capacitor, Ceramic (MLCC), 470pF, ±5%, 50V, C0G, ±5%, SMD 0603; Manufacturer: PSA(Prosperity Dielectrics); Manufacturer Part Number: FN18N471J500PSG; Package Size: 0603; JLCPCB Basic Part: No; JLCPCB Part Number: C525254; Supplier 1: LCSC; Category: Capacitors - MLCC; Supplier Part Number 1: C525254; Tolerance: ±5%; Voltage Rating: 50V; Temperature Coefficient: C0G; RoHS: Yes; ComponentLink1Description: Datasheet; ComponentLink1URL: https://wmsc.lcsc.com/wmsc/upload/file/pdf/v2/lcsc/2304140030_PSA-Prosperity-Dielectrics-FN18N471J500PSG_C525254.pdf; ComponentLink2Description: JLCPCB Part URL; ComponentLink2URL: https://jlcpcb.com/partdetail/C525254; ComponentLink3Description: LCSC Part URL; ComponentLink3URL: https://lcsc.com/product-detail/Multilayer-Ceramic-Capacitors-MLCC---SMD-SMT_PSAProsperity-Dielectrics-PSAProsperity-Dielectrics-FN18N471J500PSG_C525254.html
footprint CAP-0603 (0603 (1608M) Capacitor)
pins: 1, 2

## FN18N472J500PBG
designator C?  Capacitance: 4.7nF  (hidden comment: *)
Capacitor, Ceramic (MLCC), 4.7nF, 50V, C0G, SMD 0603; Manufacturer: PSA(Prosperity Dielectrics); Manufacturer Part Number: FN18N472J500PBG; Package Size: 0603; JLCPCB Basic Part: No; JLCPCB Part Number: C2929153; Supplier 1: LCSC; Category: Capacitors - MLCC; Supplier Part Number 1: C2929153; Voltage Rating: 50V; Temperature Coefficient: C0G; RoHS: Yes; ComponentLink1Description: Datasheet; ComponentLink1URL: https://wmsc.lcsc.com/wmsc/upload/file/pdf/v2/lcsc/2201121400_PSA-Prosperity-Dielectrics-FN18N472J500PBG_C2929153.pdf; ComponentLink2Description: JLCPCB Part URL; ComponentLink2URL: https://jlcpcb.com/partdetail/C2929153; ComponentLink3Description: LCSC Part URL; ComponentLink3URL: https://lcsc.com/product-detail/Multilayer-Ceramic-Capacitors-MLCC---SMD-SMT_PSAProsperity-Dielectrics-PSAProsperity-Dielectrics-FN18N472J500PBG_C2929153.html
footprint CAP-0603 (0603 (1608M) Capacitor)
pins: 1, 2

## FN18N560J500PSG
designator C?  Capacitance: 56pF  (hidden comment: *)
Capacitor, Ceramic (MLCC), 56pF, ±5%, 50V, C0G, ±5%, SMD 0603; Manufacturer: PSA(Prosperity Dielectrics); Manufacturer Part Number: FN18N560J500PSG; Package Size: 0603; JLCPCB Basic Part: No; JLCPCB Part Number: C525256; Supplier 1: LCSC; Category: Capacitors - MLCC; Supplier Part Number 1: C525256; Tolerance: ±5%; Voltage Rating: 50V; Temperature Coefficient: C0G; RoHS: Yes; ComponentLink1Description: Datasheet; ComponentLink1URL: https://wmsc.lcsc.com/wmsc/upload/file/pdf/v2/lcsc/2304140030_PSA-Prosperity-Dielectrics-FN18N560J500PSG_C525256.pdf; ComponentLink2Description: JLCPCB Part URL; ComponentLink2URL: https://jlcpcb.com/partdetail/C525256; ComponentLink3Description: LCSC Part URL; ComponentLink3URL: https://lcsc.com/product-detail/Multilayer-Ceramic-Capacitors-MLCC---SMD-SMT_PSAProsperity-Dielectrics-PSAProsperity-Dielectrics-FN18N560J500PSG_C525256.html
footprint CAP-0603 (0603 (1608M) Capacitor)
pins: 1, 2

## FN18N561J500PSG
designator C?  Capacitance: 560pF  (hidden comment: *)
Capacitor, Ceramic (MLCC), 560pF, ±5%, 50V, C0G, ±5%, SMD 0603; Manufacturer: PSA(Prosperity Dielectrics); Manufacturer Part Number: FN18N561J500PSG; Package Size: 0603; JLCPCB Basic Part: No; JLCPCB Part Number: C525257; Supplier 1: LCSC; Category: Capacitors - MLCC; Supplier Part Number 1: C525257; Tolerance: ±5%; Voltage Rating: 50V; Temperature Coefficient: C0G; RoHS: Yes; ComponentLink1Description: Datasheet; ComponentLink1URL: https://wmsc.lcsc.com/wmsc/upload/file/pdf/v2/lcsc/2304140030_PSA-Prosperity-Dielectrics-FN18N561J500PSG_C525257.pdf; ComponentLink2Description: JLCPCB Part URL; ComponentLink2URL: https://jlcpcb.com/partdetail/C525257; ComponentLink3Description: LCSC Part URL; ComponentLink3URL: https://lcsc.com/product-detail/Multilayer-Ceramic-Capacitors-MLCC---SMD-SMT_PSAProsperity-Dielectrics-PSAProsperity-Dielectrics-FN18N561J500PSG_C525257.html
footprint CAP-0603 (0603 (1608M) Capacitor)
pins: 1, 2

## FN18N680J500PSG
designator C?  Capacitance: 68pF  (hidden comment: *)
Capacitor, Ceramic (MLCC), 68pF, ±5%, 50V, C0G, ±5%, SMD 0603; Manufacturer: PSA(Prosperity Dielectrics); Manufacturer Part Number: FN18N680J500PSG; Package Size: 0603; JLCPCB Basic Part: No; JLCPCB Part Number: C525258; Supplier 1: LCSC; Category: Capacitors - MLCC; Supplier Part Number 1: C525258; Tolerance: ±5%; Voltage Rating: 50V; Temperature Coefficient: C0G; RoHS: Yes; ComponentLink1Description: Datasheet; ComponentLink1URL: https://wmsc.lcsc.com/wmsc/upload/file/pdf/v2/lcsc/2304140030_PSA-Prosperity-Dielectrics-FN18N680J500PSG_C525258.pdf; ComponentLink2Description: JLCPCB Part URL; ComponentLink2URL: https://jlcpcb.com/partdetail/C525258; ComponentLink3Description: LCSC Part URL; ComponentLink3URL: https://lcsc.com/product-detail/Multilayer-Ceramic-Capacitors-MLCC---SMD-SMT_PSAProsperity-Dielectrics-PSAProsperity-Dielectrics-FN18N680J500PSG_C525258.html
footprint CAP-0603 (0603 (1608M) Capacitor)
pins: 1, 2

## FN18N681G500PSG
designator C?  Capacitance: 680pF  (hidden comment: *)
Capacitor, Ceramic (MLCC), 680pF, 50V, C0G, SMD 0603; Manufacturer: PSA(Prosperity Dielectrics); Manufacturer Part Number: FN18N681G500PSG; Package Size: 0603; JLCPCB Basic Part: No; JLCPCB Part Number: C2847449; Supplier 1: LCSC; Category: Capacitors - MLCC; Supplier Part Number 1: C2847449; Voltage Rating: 50V; Temperature Coefficient: C0G; RoHS: Yes; ComponentLink1Description: Datasheet; ComponentLink1URL: https://wmsc.lcsc.com/wmsc/upload/file/pdf/v2/lcsc/2108142230_PSA-Prosperity-Dielectrics-FN18N681G500PSG_C2847449.pdf; ComponentLink2Description: JLCPCB Part URL; ComponentLink2URL: https://jlcpcb.com/partdetail/C2847449; ComponentLink3Description: LCSC Part URL; ComponentLink3URL: https://lcsc.com/product-detail/Multilayer-Ceramic-Capacitors-MLCC---SMD-SMT_PSAProsperity-Dielectrics-PSAProsperity-Dielectrics-FN18N681G500PSG_C2847449.html
footprint CAP-0603 (0603 (1608M) Capacitor)
pins: 1, 2

## FN18N681J500PSG
designator C?  Capacitance: 680pF  (hidden comment: *)
Capacitor, Ceramic (MLCC), 680pF, ±5%, 50V, NP0, ±5%, SMD 0603; Manufacturer: PSA(Prosperity Dielectrics); Manufacturer Part Number: FN18N681J500PSG; Package Size: 0603; JLCPCB Basic Part: No; JLCPCB Part Number: C525259; Supplier 1: LCSC; Category: Capacitors - MLCC; Supplier Part Number 1: C525259; Tolerance: ±5%; Voltage Rating: 50V; Temperature Coefficient: NP0; RoHS: Yes; ComponentLink1Description: Datasheet; ComponentLink1URL: https://wmsc.lcsc.com/wmsc/upload/file/pdf/v2/lcsc/2304140030_PSA-Prosperity-Dielectrics-FN18N681J500PSG_C525259.pdf; ComponentLink2Description: JLCPCB Part URL; ComponentLink2URL: https://jlcpcb.com/partdetail/C525259; ComponentLink3Description: LCSC Part URL; ComponentLink3URL: https://lcsc.com/product-detail/Multilayer-Ceramic-Capacitors-MLCC---SMD-SMT_PSAProsperity-Dielectrics-PSAProsperity-Dielectrics-FN18N681J500PSG_C525259.html
footprint CAP-0603 (0603 (1608M) Capacitor)
pins: 1, 2

## FN18N820J500PSG
designator C?  Capacitance: 82pF  (hidden comment: *)
Capacitor, Ceramic (MLCC), 82pF, ±5%, 50V, C0G, ±5%, SMD 0603; Manufacturer: PSA(Prosperity Dielectrics); Manufacturer Part Number: FN18N820J500PSG; Package Size: 0603; JLCPCB Basic Part: No; JLCPCB Part Number: C525261; Supplier 1: LCSC; Category: Capacitors - MLCC; Supplier Part Number 1: C525261; Tolerance: ±5%; Voltage Rating: 50V; Temperature Coefficient: C0G; RoHS: Yes; ComponentLink1Description: Datasheet; ComponentLink1URL: https://wmsc.lcsc.com/wmsc/upload/file/pdf/v2/lcsc/2304140030_PSA-Prosperity-Dielectrics-FN18N820J500PSG_C525261.pdf; ComponentLink2Description: JLCPCB Part URL; ComponentLink2URL: https://jlcpcb.com/partdetail/C525261; ComponentLink3Description: LCSC Part URL; ComponentLink3URL: https://lcsc.com/product-detail/Multilayer-Ceramic-Capacitors-MLCC---SMD-SMT_PSAProsperity-Dielectrics-PSAProsperity-Dielectrics-FN18N820J500PSG_C525261.html
footprint CAP-0603 (0603 (1608M) Capacitor)
pins: 1, 2

## FN18X101K500PSG
designator C?  Capacitance: 100pF  (hidden comment: *)
Capacitor, Ceramic (MLCC), 100pF, ±10%, 50V, X7R, ±10%, SMD 0603; Manufacturer: PSA(Prosperity Dielectrics); Manufacturer Part Number: FN18X101K500PSG; Package Size: 0603; JLCPCB Basic Part: No; JLCPCB Part Number: C2874750; Supplier 1: LCSC; Category: Capacitors - MLCC; Supplier Part Number 1: C2874750; Tolerance: ±10%; Voltage Rating: 50V; Temperature Coefficient: X7R; RoHS: Yes; ComponentLink1Description: Datasheet; ComponentLink1URL: https://wmsc.lcsc.com/wmsc/upload/file/pdf/v2/lcsc/2108150330_PSA-Prosperity-Dielectrics-FN18X101K500PSG_C2874750.pdf; ComponentLink2Description: JLCPCB Part URL; ComponentLink2URL: https://jlcpcb.com/partdetail/C2874750; ComponentLink3Description: LCSC Part URL; ComponentLink3URL: https://lcsc.com/product-detail/Multilayer-Ceramic-Capacitors-MLCC---SMD-SMT_PSAProsperity-Dielectrics-PSAProsperity-Dielectrics-FN18X101K500PSG_C2874750.html
footprint CAP-0603 (0603 (1608M) Capacitor)
pins: 1, 2

## FN18X102J500PSG
designator C?  Capacitance: 1nF  (hidden comment: *)
Capacitor, Ceramic (MLCC), 1nF, 50V, X7R, SMD 0603; Manufacturer: PSA(Prosperity Dielectrics); Manufacturer Part Number: FN18X102J500PSG; Package Size: 0603; JLCPCB Basic Part: No; JLCPCB Part Number: C2874753; Supplier 1: LCSC; Category: Capacitors - MLCC; Supplier Part Number 1: C2874753; Voltage Rating: 50V; Temperature Coefficient: X7R; RoHS: Yes; ComponentLink1Description: Datasheet; ComponentLink1URL: https://wmsc.lcsc.com/wmsc/upload/file/pdf/v2/lcsc/2108150330_PSA-Prosperity-Dielectrics-FN18X102J500PSG_C2874753.pdf; ComponentLink2Description: JLCPCB Part URL; ComponentLink2URL: https://jlcpcb.com/partdetail/C2874753; ComponentLink3Description: LCSC Part URL; ComponentLink3URL: https://lcsc.com/product-detail/Multilayer-Ceramic-Capacitors-MLCC---SMD-SMT_PSAProsperity-Dielectrics-PSAProsperity-Dielectrics-FN18X102J500PSG_C2874753.html
footprint CAP-0603 (0603 (1608M) Capacitor)
pins: 1, 2

## FN18X102K500PSG
designator C?  Capacitance: 1nF  (hidden comment: *)
Capacitor, Ceramic (MLCC), 1nF, ±10%, 50V, X7R, ±10%, SMD 0603; Manufacturer: PSA(Prosperity Dielectrics); Manufacturer Part Number: FN18X102K500PSG; Package Size: 0603; JLCPCB Basic Part: No; JLCPCB Part Number: C525263; Supplier 1: LCSC; Category: Capacitors - MLCC; Supplier Part Number 1: C525263; Tolerance: ±10%; Voltage Rating: 50V; Temperature Coefficient: X7R; RoHS: Yes; ComponentLink1Description: Datasheet; ComponentLink1URL: https://wmsc.lcsc.com/wmsc/upload/file/pdf/v2/lcsc/2304140030_PSA-Prosperity-Dielectrics-FN18X102K500PSG_C525263.pdf; ComponentLink2Description: JLCPCB Part URL; ComponentLink2URL: https://jlcpcb.com/partdetail/C525263; ComponentLink3Description: LCSC Part URL; ComponentLink3URL: https://lcsc.com/product-detail/Multilayer-Ceramic-Capacitors-MLCC---SMD-SMT_PSAProsperity-Dielectrics-PSAProsperity-Dielectrics-FN18X102K500PSG_C525263.html
footprint CAP-0603 (0603 (1608M) Capacitor)
pins: 1, 2

## FN18X103J500PSG
designator C?  Capacitance: 10nF  (hidden comment: *)
Capacitor, Ceramic (MLCC), 10nF, ±5%, 50V, X7R, ±5%, SMD 0603; Manufacturer: PSA(Prosperity Dielectrics); Manufacturer Part Number: FN18X103J500PSG; Package Size: 0603; JLCPCB Basic Part: No; JLCPCB Part Number: C2874752; Supplier 1: LCSC; Category: Capacitors - MLCC; Supplier Part Number 1: C2874752; Tolerance: ±5%; Voltage Rating: 50V; Temperature Coefficient: X7R; RoHS: Yes; ComponentLink1Description: Datasheet; ComponentLink1URL: https://wmsc.lcsc.com/wmsc/upload/file/pdf/v2/lcsc/2108150330_PSA-Prosperity-Dielectrics-FN18X103J500PSG_C2874752.pdf; ComponentLink2Description: JLCPCB Part URL; ComponentLink2URL: https://jlcpcb.com/partdetail/C2874752; ComponentLink3Description: LCSC Part URL; ComponentLink3URL: https://lcsc.com/product-detail/Multilayer-Ceramic-Capacitors-MLCC---SMD-SMT_PSAProsperity-Dielectrics-PSAProsperity-Dielectrics-FN18X103J500PSG_C2874752.html
footprint CAP-0603 (0603 (1608M) Capacitor)
pins: 1, 2

## FN18X103K500PSG
designator C?  Capacitance: 10nF  (hidden comment: *)
Capacitor, Ceramic (MLCC), 10nF, ±10%, 50V, X7R, ±10%, SMD 0603; Manufacturer: PSA(Prosperity Dielectrics); Manufacturer Part Number: FN18X103K500PSG; Package Size: 0603; JLCPCB Basic Part: No; JLCPCB Part Number: C525264; Supplier 1: LCSC; Category: Capacitors - MLCC; Supplier Part Number 1: C525264; Tolerance: ±10%; Voltage Rating: 50V; Temperature Coefficient: X7R; RoHS: Yes; ComponentLink1Description: Datasheet; ComponentLink1URL: https://wmsc.lcsc.com/wmsc/upload/file/pdf/v2/lcsc/2304140030_PSA-Prosperity-Dielectrics-FN18X103K500PSG_C525264.pdf; ComponentLink2Description: JLCPCB Part URL; ComponentLink2URL: https://jlcpcb.com/partdetail/C525264; ComponentLink3Description: LCSC Part URL; ComponentLink3URL: https://lcsc.com/product-detail/Multilayer-Ceramic-Capacitors-MLCC---SMD-SMT_PSAProsperity-Dielectrics-PSAProsperity-Dielectrics-FN18X103K500PSG_C525264.html
footprint CAP-0603 (0603 (1608M) Capacitor)
pins: 1, 2